# Altium footprint library 13-IC Packages-1bga1.PcbLib: 72 footprints (part 5 of 6) (continued)
## CI_ATMEL_TFBGA324_0MM8_SOCKET6088 [mm] (continued)
Top Layer keep-out:
  circle w0.025: c-8.863,-8.863 r1.805
  circle w0.025: c-8.863,8.863 r1.805
  circle w0.025: c8.863,-8.863 r1.805
  circle w0.025: c8.863,8.863 r1.805
Bottom Layer keep-out:
  circle w0.025: c-8.863,-8.863 r1.805
  circle w0.025: c-8.863,8.863 r1.805
  circle w0.025: c8.863,-8.863 r1.805
  circle w0.025: c8.863,8.863 r1.805
Top Overlay:
  lines w0.18: -8.703,6.8 -8.703,8.95 -6.552,8.95 ; -9.927,-10.175 -9.927,-3.185 -9.062,-3.185 -9.062,6.94 -9.927,6.94 -9.927,10.175 -6.692,10.175 -6.693,9.31 7.188,9.31 7.187,10.175 10.422,10.175 10.422,4.94 9.558,4.94 9.557,-7.185 10.422,-7.185 10.422,-10.175 7.187,-10.175 7.188,-9.31 -6.693,-9.31 -6.692,-10.175 -9.927,-10.175 ; -7.278,-7.525 -7.278,7.525 7.773,7.525 7.773,-7.525 -7.278,-7.525
Top Solder:
  drawing of 6 lines, arcs and shapes, not listed
Bottom Solder:
  drawing of 6 lines, arcs and shapes, not listed
Mechanical 6:
  lines w0.18: -8.703,6.8 -8.703,8.089 ; -8.077,8.95 -6.552,8.95 ; -9.927,-10.175 -9.927,-3.185 -9.062,-3.185 -9.062,6.94 -9.927,6.94 -9.927,10.175 -6.692,10.175 -6.693,9.31 7.188,9.31 7.187,10.175 10.422,10.175 10.422,4.94 9.558,4.94 9.557,-7.185 10.422,-7.185 10.422,-10.175 7.187,-10.175 7.188,-9.31 -6.693,-9.31 -6.692,-10.175 -9.927,-10.175 ; -7.278,-7.525 -7.278,7.525 7.773,7.525 7.773,-7.525 -7.278,-7.525
Mechanical 8:
  text "2.54" at 12.563,6.613 h0.5
  text "15.05" at 11.497,-2.125 h0.5
  text "3.235" at -4.903,11.83 h0.5
  text "3.235" at -11.923,3.265 h0.5
  text "0.8" at -1.837,10.67 h0.5
  text "20.35" at 14.087,-3.05 h0.5
  text "20.35" at -1.457,16.01 h0.5
  text "2.06" at -13.128,5.227 h0.5
  text "17.725" at -0.275,13.915 h0.5
  text "2.31" at -5.115,12.85 h0.5
  text "17.725" at -15.428,-1.413 h0.5
Mechanical 16:
  drawing of 36 lines, arcs and shapes, not listed
Multi-Layer keep-out:
  circle w0.025: c-8.863,-8.863 r1.305
  circle w0.025: c8.863,-8.863 r1.305
  circle w0.025: c8.863,8.863 r1.305
  circle w0.025: c-8.863,8.863 r1.305
  circle w0.025: c-8.863,-3.783 r0.925
  circle w0.025: c8.862,6.323 r0.925
Mechanical 18:
  text "A8" at -0.811,6.941 h0.25
  text "E9" at -0.011,3.741 h0.25
  text "B6" at -2.411,6.141 h0.25
  text "B7" at -1.611,6.141 h0.25
  text "A5" at -3.211,6.941 h0.25
  text "D7" at -1.611,4.541 h0.25
  text "C6" at -2.411,5.341 h0.25
  text "E7" at -1.611,3.741 h0.25
  text "B5" at -3.211,6.141 h0.25
  text "D6" at -2.411,4.541 h0.25
  text "F7" at -1.611,2.941 h0.25
  text "A4" at -4.011,6.941 h0.25
  text "C5" at -3.211,5.341 h0.25
  text "B4" at -4.011,6.141 h0.25
  text "E6" at -2.411,3.741 h0.25
  text "D5" at -3.211,4.541 h0.25
  text "A3" at -4.811,6.941 h0.25
  text "C4" at -4.011,5.341 h0.25
  text "A1" at -6.411,6.941 h0.25
  text "A2" at -5.611,6.941 h0.25
  text "B2" at -5.611,6.141 h0.25
  text "B3" at -4.811,6.141 h0.25
  text "B1" at -6.411,6.141 h0.25
  text "D8" at -0.811,4.541 h0.25
  text "A6" at -2.411,6.941 h0.25
  text "C7" at -1.611,5.341 h0.25
  text "D9" at -0.011,4.541 h0.25
  text "A9" at -0.011,6.941 h0.25
  text "E15" at 4.86,3.812 h0.25
  text "E16" at 5.66,3.812 h0.25
  text "D18" at 7.26,4.612 h0.25
  text "D17" at 6.46,4.612 h0.25
  text "C18" at 7.26,5.412 h0.25
  text "B18" at 7.26,6.212 h0.25
  text "A18" at 7.26,7.012 h0.25
  text "B17" at 6.46,6.212 h0.25
  text "C10" at 0.86,5.412 h0.25
  text "B10" at 0.86,6.212 h0.25
  text "C17" at 6.46,5.412 h0.25
  text "A17" at 6.46,7.012 h0.25
  text "D15" at 4.86,4.612 h0.25
  text "C15" at 4.86,5.412 h0.25
  text "V14" at 4.06,-6.588 h0.25
  text "B16" at 5.66,6.212 h0.25
  text "B15" at 4.86,6.212 h0.25
  text "D14" at 4.06,4.612 h0.25
  text "C14" at 4.06,5.412 h0.25
  text "A15" at 4.86,7.012 h0.25
  text "B14" at 4.06,6.212 h0.25
  text "P6" at -2.411,-3.459 h0.25
  text "D13" at 3.26,4.612 h0.25
  text "C13" at 3.26,5.412 h0.25
  text "C1" at -6.411,5.341 h0.25
  text "E13" at 3.26,3.812 h0.25
  text "B13" at 3.26,6.212 h0.25
  text "E12" at 2.46,3.812 h0.25
  text "V9" at -0.011,-6.659 h0.25
  text "D1" at -6.411,4.541 h0.25
  text "D12" at 2.46,4.612 h0.25
  text "C12" at 2.46,5.412 h0.25
  text "H1" at -6.411,1.341 h0.25
  text "M3" at -4.811,-1.859 h0.25
  text "F2" at -5.611,2.941 h0.25
  text "M4" at -4.011,-1.859 h0.25
  text "R9" at -0.011,-4.259 h0.25
  text "L7" at -1.611,-1.059 h0.25
  text "T8" at -0.811,-5.059 h0.25
  text "N4" at -4.011,-2.659 h0.25
  text "L11" at 1.66,-0.988 h0.25
  text "P1" at -6.411,-3.459 h0.25
  text "T10" at 0.86,-4.988 h0.25
  text "M5" at -3.211,-1.859 h0.25
  text "M6" at -2.411,-1.859 h0.25
  text "P2" at -5.611,-3.459 h0.25
  text "V8" at -0.811,-6.659 h0.25
  text "N2" at -5.611,-2.659 h0.25
  text "N3" at -4.811,-2.659 h0.25
  text "N5" at -3.211,-2.659 h0.25
  text "R1" at -6.411,-4.259 h0.25
  text "P3" at -4.811,-3.459 h0.25
  text "R4" at -4.011,-4.259 h0.25
  text "V2" at -5.611,-6.659 h0.25
  text "N6" at -2.411,-2.659 h0.25
  text "G1" at -6.411,2.141 h0.25
  text "U8" at -0.811,-5.859 h0.25
  text "L1" at -6.411,-1.059 h0.25
  text "U3" at -4.811,-5.859 h0.25
  text "U2" at -5.611,-5.859 h0.25
  text "T7" at -1.611,-5.059 h0.25
  text "P4" at -4.011,-3.459 h0.25
  text "V3" at -4.811,-6.659 h0.25
  text "U1" at -6.411,-5.859 h0.25
  text "U9" at -0.011,-5.859 h0.25
  text "U4" at -4.011,-5.859 h0.25
  text "M9" at -0.011,-1.859 h0.25
  text "L10" at 0.86,-0.988 h0.25
  text "D2" at -5.611,4.541 h0.25
  text "V1" at -6.411,-6.659 h0.25
  text "F3" at -4.811,2.941 h0.25
  text "G2" at -5.611,2.141 h0.25
  text "E2" at -5.611,3.741 h0.25
  text "F1" at -6.411,2.941 h0.25
  text "E1" at -6.411,3.741 h0.25
  text "T9" at -0.011,-5.059 h0.25
  text "L9" at -0.011,-1.059 h0.25
  text "B8" at -0.811,6.141 h0.25
  text "C8" at -0.811,5.341 h0.25
  text "R7" at -1.611,-4.259 h0.25
  text "F9" at -0.011,2.941 h0.25
  text "V7" at -1.611,-6.659 h0.25
  text "J16" at 5.66,0.612 h0.25
  text "G17" at 6.46,2.212 h0.25
  text "G16" at 5.66,2.212 h0.25
  text "J18" at 7.26,0.612 h0.25
  text "H18" at 7.26,1.412 h0.25
  text "H14" at 4.06,1.412 h0.25
  text "M10" at 0.86,-1.788 h0.25
  text "H15" at 4.86,1.412 h0.25
  text "J17" at 6.46,0.612 h0.25
  text "H17" at 6.46,1.412 h0.25
  text "V11" at 1.66,-6.588 h0.25
  text "G18" at 7.26,2.212 h0.25
  text "V16" at 5.66,-6.588 h0.25
  text "G14" at 4.06,2.212 h0.25
  text "R2" at -5.611,-4.259 h0.25
  text "H16" at 5.66,1.412 h0.25
  text "R8" at -0.811,-4.259 h0.25
  text "G15" at 4.86,2.212 h0.25
  text "V12" at 2.46,-6.588 h0.25
  text "A13" at 3.26,7.012 h0.25
  text "B12" at 2.46,6.212 h0.25
  text "F10" at 0.86,3.012 h0.25
  text "V15" at 4.86,-6.588 h0.25
  text "F12" at 2.46,3.012 h0.25
  text "A14" at 4.06,7.012 h0.25
  text "C11" at 1.66,5.412 h0.25
  text "A11" at 1.66,7.012 h0.25
  text "E11" at 1.66,3.812 h0.25
  text "B11" at 1.66,6.212 h0.25
  text "D11" at 1.66,4.612 h0.25
  text "A12" at 2.46,7.012 h0.25
  text "C9" at -0.011,5.341 h0.25
  text "A10" at 0.86,7.012 h0.25
  text "F11" at 1.66,3.012 h0.25
  text "D10" at 0.86,4.612 h0.25
  text "N13" at 3.26,-2.588 h0.25
  text "E10" at 0.86,3.812 h0.25
  text "P12" at 2.46,-3.388 h0.25
  text "T15" at 4.86,-4.988 h0.25
  text "R12" at 2.46,-4.188 h0.25
  text "T16" at 5.66,-4.988 h0.25
  text "N12" at 2.46,-2.588 h0.25
  text "M12" at 2.46,-1.788 h0.25
  text "T11" at 1.66,-4.988 h0.25
  text "U14" at 4.06,-5.788 h0.25
  text "L8" at -0.811,-1.059 h0.25
  text "M13" at 3.26,-1.788 h0.25
  text "T12" at 2.46,-4.988 h0.25
  text "V4" at -4.011,-6.659 h0.25
  text "M8" at -0.811,-1.859 h0.25
  text "N11" at 1.66,-2.588 h0.25
  text "U13" at 3.26,-5.788 h0.25
  text "R6" at -2.411,-4.259 h0.25
  text "M11" at 1.66,-1.788 h0.25
  text "V6" at -2.411,-6.659 h0.25
  text "R5" at -3.211,-4.259 h0.25
  text "N9" at -0.011,-2.659 h0.25
  text "T5" at -3.211,-5.059 h0.25
  text "U5" at -3.211,-5.859 h0.25
  text "P13" at 3.26,-3.388 h0.25
  text "R18" at 7.26,-4.188 h0.25
  text "M7" at -1.611,-1.859 h0.25
  text "R13" at 3.26,-4.188 h0.25
  text "T13" at 3.26,-4.988 h0.25
  text "P7" at -1.611,-3.459 h0.25
  text "A7" at -1.611,6.941 h0.25
  text "T18" at 7.26,-4.988 h0.25
  text "H2" at -5.611,1.341 h0.25
  text "U7" at -1.611,-5.859 h0.25
  text "N8" at -0.811,-2.659 h0.25
  text "H8" at -0.811,1.341 h0.25
  text "G6" at -2.411,2.141 h0.25
  text "P8" at -0.811,-3.459 h0.25
  text "J5" at -3.211,0.541 h0.25
  text "L4" at -4.011,-1.059 h0.25
  text "G8" at -0.811,2.141 h0.25
  text "H7" at -1.611,1.341 h0.25
  text "H6" at -2.411,1.341 h0.25
  text "R3" at -4.811,-4.259 h0.25
  text "J3" at -4.811,0.541 h0.25
  text "M1" at -6.411,-1.859 h0.25
  text "H4" at -4.011,1.341 h0.25
  text "T1" at -6.411,-5.059 h0.25
  text "J2" at -5.611,0.541 h0.25
  text "N1" at -6.411,-2.659 h0.25
  text "J4" at -4.011,0.541 h0.25
  text "L5" at -3.211,-1.059 h0.25
  text "J6" at -2.411,0.541 h0.25
  text "K3" at -4.811,-0.259 h0.25
  text "M2" at -5.611,-1.859 h0.25
  text "J1" at -6.411,0.541 h0.25
  text "P5" at -3.211,-3.459 h0.25
  text "T2" at -5.611,-5.059 h0.25
  text "K6" at -2.411,-0.259 h0.25
  text "T3" at -4.811,-5.059 h0.25
  text "K4" at -4.011,-0.259 h0.25
  text "K8" at -0.811,-0.259 h0.25
  text "L6" at -2.411,-1.059 h0.25
  text "K5" at -3.211,-0.259 h0.25
  text "J8" at -0.811,0.541 h0.25
  text "T4" at -4.011,-5.059 h0.25
  text "K2" at -5.611,-0.259 h0.25
  text "K7" at -1.611,-0.259 h0.25
  text "L3" at -4.811,-1.059 h0.25
  text "K1" at -6.411,-0.259 h0.25
  text "J7" at -1.611,0.541 h0.25
  text "L2" at -5.611,-1.059 h0.25
  text "G4" at -4.011,2.141 h0.25
  text "F4" at -4.011,2.941 h0.25
  text "G5" at -3.211,2.141 h0.25
  text "H5" at -3.211,1.341 h0.25
  text "F5" at -3.211,2.941 h0.25
  text "V18" at 7.26,-6.588 h0.25
  text "G7" at -1.611,2.141 h0.25
  text "G3" at -4.811,2.141 h0.25
  text "F8" at -0.811,2.941 h0.25
  text "R16" at 5.66,-4.188 h0.25
  text "R15" at 4.86,-4.188 h0.25
  text "T14" at 4.06,-4.988 h0.25
  text "P15" at 4.86,-3.388 h0.25
  text "P16" at 5.66,-3.388 h0.25
  text "P17" at 6.46,-3.388 h0.25
  text "R14" at 4.06,-4.188 h0.25
  text "P14" at 4.06,-3.388 h0.25
  text "N15" at 4.86,-2.588 h0.25
  text "P9" at -0.011,-3.459 h0.25
  text "N16" at 5.66,-2.588 h0.25
  text "P18" at 7.26,-3.388 h0.25
  text "N17" at 6.46,-2.588 h0.25
  text "N18" at 7.26,-2.588 h0.25
  text "N14" at 4.06,-2.588 h0.25
  text "M15" at 4.86,-1.788 h0.25
  text "M16" at 5.66,-1.788 h0.25
  text "E5" at -3.211,3.741 h0.25
  text "E8" at -0.811,3.741 h0.25
  text "C16" at 5.66,5.412 h0.25
  text "D3" at -4.811,4.541 h0.25
  text "H13" at 3.26,1.412 h0.25
  text "J12" at 2.46,0.612 h0.25
  text "J13" at 3.26,0.612 h0.25
  text "U12" at 2.46,-5.788 h0.25
  text "U17" at 6.46,-5.788 h0.25
  text "G9" at -0.011,2.141 h0.25
  text "H9" at -0.011,1.341 h0.25
  text "H10" at 0.86,1.412 h0.25
  text "H12" at 2.46,1.412 h0.25
  text "J9" at -0.011,0.541 h0.25
  text "J10" at 0.86,0.612 h0.25
  text "J11" at 1.66,0.612 h0.25
  text "K11" at 1.66,-0.188 h0.25
  text "K12" at 2.46,-0.188 h0.25
  text "M17" at 6.46,-1.788 h0.25
  text "L14" at 4.06,-0.988 h0.25
  text "M18" at 7.26,-1.788 h0.25
  text "A16" at 5.66,7.012 h0.25
  text "L15" at 4.86,-0.988 h0.25
  text "L16" at 5.66,-0.988 h0.25
  text "L18" at 7.26,-0.988 h0.25
  text "L17" at 6.46,-0.988 h0.25
  text "K14" at 4.06,-0.188 h0.25
  text "K15" at 4.86,-0.188 h0.25
  text "K16" at 5.66,-0.188 h0.25
  text "K18" at 7.26,-0.188 h0.25
  text "K17" at 6.46,-0.188 h0.25
  text "J14" at 4.06,0.612 h0.25
  text "J15" at 4.86,0.612 h0.25
  text "U18" at 7.26,-5.788 h0.25
  text "E3" at -4.811,3.741 h0.25
  text "U11" at 1.66,-5.788 h0.25
  text "V17" at 6.46,-6.588 h0.25
  text "P11" at 1.66,-3.388 h0.25
  text "C2" at -5.611,5.341 h0.25
  text "K9" at -0.011,-0.259 h0.25
  text "K10" at 0.86,-0.188 h0.25
  text "V13" at 3.26,-6.588 h0.25
  text "D4" at -4.011,4.541 h0.25
  text "G12" at 2.46,2.212 h0.25
  text "G13" at 3.26,2.212 h0.25
  text "E18" at 7.26,3.812 h0.25
  text "H11" at 1.66,1.412 h0.25
  text "H3" at -4.811,1.341 h0.25
  text "D16" at 5.66,4.612 h0.25
  text "F6" at -2.411,2.941 h0.25
  text "G10" at 0.86,2.212 h0.25
  text "G11" at 1.66,2.212 h0.25
  text "C3" at -4.811,5.341 h0.25
  text "K13" at 3.26,-0.188 h0.25
  text "L12" at 2.46,-0.988 h0.25
  text "L13" at 3.26,-0.988 h0.25
  text "M14" at 4.06,-1.788 h0.25
  text "F13" at 3.26,3.012 h0.25
  text "F14" at 4.06,3.012 h0.25
  text "F18" at 7.26,3.012 h0.25
  text "F15" at 4.86,3.012 h0.25
  text "E14" at 4.06,3.812 h0.25
  text "F17" at 6.46,3.012 h0.25
  text "F16" at 5.66,3.012 h0.25
  text "E17" at 6.46,3.812 h0.25
  text "U16" at 5.66,-5.788 h0.25
  text "R17" at 6.46,-4.188 h0.25
  text "T17" at 6.46,-4.988 h0.25
  text "U15" at 4.86,-5.788 h0.25
  text "R10" at 0.86,-4.188 h0.25
  text "P10" at 0.86,-3.388 h0.25
  text "N10" at 0.86,-2.588 h0.25
  text "V10" at 0.86,-6.588 h0.25
  text "U10" at 0.86,-5.788 h0.25
  text "R11" at 1.66,-4.188 h0.25
  text "B9" at -0.011,6.141 h0.25
  text "E4" at -4.011,3.741 h0.25
  text "U6" at -2.411,-5.859 h0.25
  text "T6" at -2.411,-5.059 h0.25
  text "N7" at -1.611,-2.659 h0.25
  text "V5" at -3.211,-6.659 h0.25
Mechanical 20:
  text ".Designator" at 0.772,1.231 h1.12
Mechanical 29:
  text "3MM" at -1.253,-8.5 h0.5
3D body "tfbga-324.stp": height 1.2, standoff 0, extent -7.271,-7.5 7.729,7.5

## CI_MICRON_FBGA60_8X10_ARM [mm]
height 25.75
pads (60):
  round 0.4 smd: A1(-3.2,4) A2(-2.4,4) A3(-1.6,4) A7(1.6,4) A8(2.4,4) A9(3.2,4) B1(-3.2,3.2) B2(-2.4,3.2) B3(-1.6,3.2) B7(1.6,3.2) B8(2.4,3.2) B9(3.2,3.2) C1(-3.2,2.4) C2(-2.4,2.4) C3(-1.6,2.4) C7(1.6,2.4) C8(2.4,2.4) C9(3.2,2.4) D1(-3.2,1.6) D2(-2.4,1.6) D3(-1.6,1.6) D7(1.6,1.6) D8(2.4,1.6) D9(3.2,1.6) E1(-3.2,0.8) E2(-2.4,0.8) E3(-1.6,0.8) E7(1.6,0.8) E8(2.4,0.8) E9(3.2,0.8) F2(-2.4,0) F3(-1.6,0) F7(1.6,0) F8(2.4,0) F9(3.2,0) G1(-3.2,-0.8) G2(-2.4,-0.8) G3(-1.6,-0.8) G7(1.6,-0.8) G8(2.4,-0.8) H2(-2.4,-1.6) H3(-1.6,-1.6) H7(1.6,-1.6) H8(2.4,-1.6) H9(3.2,-1.6) J1(-3.2,-2.4) J2(-2.4,-2.4) J3(-1.6,-2.4) J7(1.6,-2.4) J8(2.4,-2.4) K2(-2.4,-3.2) K3(-1.6,-3.2) K7(1.6,-3.2) K8(2.4,-3.2) K9(3.2,-3.2) L1(-3.2,-4) L2(-2.4,-4) L3(-1.6,-4) L7(1.6,-4) L8(2.4,-4)
Top Overlay:
  region: -4.089,4.343 -3.378,5.055 -3.378,5.105 -4.064,5.105 -4.089,5.08
  lines w0.18: -4.465,4.445 -4.465,5.465 -3.429,5.465 ; -4.075,-5.075 4.075,-5.075 4.075,5.075 -4.075,5.075 -4.075,-5.075
Mechanical 6:
  lines w0.18: -4.465,4.445 -4.465,5.465 -3.429,5.465 ; -4.075,-5.075 4.075,-5.075 4.075,5.075 -4.075,5.075 -4.075,-5.075
Mechanical 8:
  text "8.15" at -1.188,9.15 h0.5
  text "0.8" at -4.25,-1.5 h0.5
  text "8" at 4.65,0.625 h0.5
  text "1.075" at -6.15,1.175 h0.5
  text "10.15" at 5.85,-1.225 h0.5
  text "6.4" at -0.65,-6.6 h0.5
  text "1.875" at 6.125,6.4 h0.5
  text "3.2" at -0.65,6.4 h0.5
  text "0.8" at -1.65,7.4 h0.5
Mechanical 16:
  circle w0.025: c-3.2,4 r0.4
  lines w0.025: -4.075,-5.075 4.075,-5.075 4.075,5.075 -4.075,5.075 -4.075,-5.075
Mechanical 18:
  text "A8" at 2.6,4 h0.25
  text "G1" at -3,-0.8 h0.25
  text "L3" at -1.4,-4 h0.25
  text "L7" at 1.8,-4 h0.25
  text "A2" at -2.2,4 h0.25
  text "H8" at 2.6,-1.6 h0.25
  text "H3" at -1.4,-1.6 h0.25
  text "H7" at 1.8,-1.6 h0.25
  text "J2" at -2.2,-2.4 h0.25
  text "J8" at 2.6,-2.4 h0.25
  text "J3" at -1.4,-2.4 h0.25
  text "J7" at 1.8,-2.4 h0.25
  text "K2" at -2.2,-3.2 h0.25
  text "K8" at 2.6,-3.2 h0.25
  text "K3" at -1.4,-3.2 h0.25
  text "H2" at -2.2,-1.6 h0.25
  text "K7" at 1.8,-3.2 h0.25
  text "A1" at -3,4 h0.25
  text "A9" at 3.4,4 h0.25
  text "C1" at -3,2.4 h0.25
  text "C3" at -1.4,2.4 h0.25
  text "C7" at 1.8,2.4 h0.25
  text "C9" at 3.4,2.4 h0.25
  text "E1" at -3,0.8 h0.25
  text "E9" at 3.4,0.8 h0.25
  text "H9" at 3.4,-1.6 h0.25
  text "L1" at -3,-4 h0.25
  text "A3" at -1.4,4 h0.25
  text "A7" at 1.8,4 h0.25
  text "B2" at -2.2,3.2 h0.25
  text "B8" at 2.6,3.2 h0.25
  text "D2" at -2.2,1.6 h0.25
  text "D8" at 2.6,1.6 h0.25
  text "E3" at -1.4,0.8 h0.25
  text "E7" at 1.8,0.8 h0.25
  text "F9" at 3.4,0 h0.25
  text "J1" at -3,-2.4 h0.25
  text "K9" at 3.4,-3.2 h0.25
  text "E2" at -2.2,0.8 h0.25
  text "C8" at 2.6,2.4 h0.25
  text "C2" at -2.2,2.4 h0.25
  text "D7" at 1.8,1.6 h0.25
  text "D3" at -1.4,1.6 h0.25
  text "D1" at -3,1.6 h0.25
  text "D9" at 3.4,1.6 h0.25
  text "B1" at -3,3.2 h0.25
  text "B9" at 3.4,3.2 h0.25
  text "G2" at -2.2,-0.8 h0.25
  text "F2" at -2.2,0 h0.25
  text "G3" at -1.4,-0.8 h0.25
  text "E8" at 2.6,0.8 h0.25
  text "F8" at 2.6,0 h0.25
  text "F3" at -1.4,0 h0.25
  text "G7" at 1.8,-0.8 h0.25
  text "G8" at 2.6,-0.8 h0.25
  text "F7" at 1.8,0 h0.25
  text "B7" at 1.8,3.2 h0.25
  text "B3" at -1.4,3.2 h0.25
  text "L8" at 2.6,-4 h0.25
  text "L2" at -2.2,-4 h0.25
Mechanical 20:
  text ".Designator" at 1.241,0.5 h1.12
Mechanical 29:
  text "5MM" at -8.8,-8.3 h0.5
  text "3MM" at -6.1,-7.5 h0.5
3D body "fbga60-8x10.stp": height 1, standoff 0, extent -4.075,-5.075 4.075,5.075

## CI_MICRON_VFBGA63_0MM8 [mm]
height 25.75
pads (63):
  round 0.4 smd: A1(-3.6,4.4) A2(-2.8,4.4) A9(2.8,4.4) A10(3.6,4.4) B1(-3.6,3.6) B9(2.8,3.6) B10(3.6,3.6) C3(-2,2.8) C4(-1.2,2.8) C5(-0.4,2.8) C6(0.4,2.8) C7(1.2,2.8) C8(2,2.8) D3(-2,2) D4(-1.2,2) D5(-0.4,2) D6(0.4,2) D7(1.2,2) D8(2,2) E3(-2,1.2) E4(-1.2,1.2) E5(-0.4,1.2) E6(0.4,1.2) E7(1.2,1.2) E8(2,1.2) F3(-2,0.4) F4(-1.2,0.4) F5(-0.4,0.4) F6(0.4,0.4) F7(1.2,0.4) F8(2,0.4) G3(-2,-0.4) G4(-1.2,-0.4) G5(-0.4,-0.4) G6(0.4,-0.4) G7(1.2,-0.4) G8(2,-0.4) H3(-2,-1.2) H4(-1.2,-1.2) H5(-0.4,-1.2) H6(0.4,-1.2) H7(1.2,-1.2) H8(2,-1.2) J3(-2,-2) J4(-1.2,-2) J5(-0.4,-2) J6(0.4,-2) J7(1.2,-2) J8(2,-2) K3(-2,-2.8) K4(-1.2,-2.8) K5(-0.4,-2.8) K6(0.4,-2.8) K7(1.2,-2.8) K8(2,-2.8) L1(-3.6,-3.6) L2(-2.8,-3.6) L9(2.8,-3.6) L10(3.6,-3.6) M1(-3.6,-4.4) M2(-2.8,-4.4) M9(2.8,-4.4) M10(3.6,-4.4)
Top Overlay:
  lines w0.18: -5.675,4.775 -5.675,6.925 -3.525,6.925 ; -5.3,-6.55 -5.3,6.55 5.3,6.55 5.3,-6.55 -5.3,-6.55
Mechanical 6:
  lines w0.18: -5.675,4.775 -5.675,6.925 -3.525,6.925 ; -5.3,-6.55 -5.3,6.55 5.3,6.55 5.3,-6.55 -5.3,-6.55
Mechanical 8:
  text "0.8" at -0.6,7.6 h0.5
  text "10.6" at 1.062,8.65 h0.5
  text "13.1" at 6.55,-0.787 h0.5
Mechanical 16:
  circle w0.025: c-4,5.2 r0.4
  lines w0.025: -5.3,-6.55 -5.3,6.55 5.3,6.55 5.3,-6.55 -5.3,-6.55
Mechanical 18:
  text "C4" at -1.67,2.8 h0.25
  text "H4" at -1.67,-1.2 h0.25
  text "J4" at -1.67,-2 h0.25
  text "K4" at -1.67,-2.8 h0.25
  text "K5" at -0.87,-2.8 h0.25
  text "K6" at -0.07,-2.8 h0.25
  text "J7" at 0.73,-2 h0.25
  text "K7" at 0.73,-2.8 h0.25
  text "J8" at 1.53,-2 h0.25
  text "H3" at -2.47,-1.2 h0.25
  text "J3" at -2.47,-2 h0.25
  text "H5" at -0.87,-1.2 h0.25
  text "J5" at -0.87,-2 h0.25
  text "H6" at -0.07,-1.2 h0.25
  text "G6" at -0.07,-0.4 h0.25
  text "H7" at 0.73,-1.2 h0.25
  text "G7" at 0.73,-0.4 h0.25
  text "D3" at -2.47,2 h0.25
  text "G4" at -1.67,-0.4 h0.25
  text "H8" at 1.53,-1.2 h0.25
  text "J6" at -0.07,-2 h0.25
  text "D5" at -0.87,2 h0.25
  text "C7" at 0.73,2.8 h0.25
  text "C8" at 1.53,2.8 h0.25
  text "C6" at -0.07,2.8 h0.25
  text "C5" at -0.87,2.8 h0.25
  text "F7" at 0.73,0.4 h0.25
  text "K3" at -2.47,-2.8 h0.25
  text "K8" at 1.53,-2.8 h0.25
  text "C3" at -2.47,2.8 h0.25
  text "D4" at -1.67,2 h0.25
  text "D7" at 0.73,2 h0.25
  text "D6" at -0.07,2 h0.25
  text "B10" at 3.3,3.6 h0.25
  text "B9" at 2.6,3.6 h0.25
  text "B1" at -3.8,3.6 h0.25
  text "A10" at 3.3,4.4 h0.25
  text "M10" at 3.3,-4.4 h0.25
  text "M9" at 2.6,-4.4 h0.25
  text "M2" at -3,-4.4 h0.25
  text "M1" at -3.8,-4.4 h0.25
  text "L10" at 3.3,-3.6 h0.25
  text "L9" at 2.6,-3.6 h0.25
  text "A9" at 2.6,4.4 h0.25
  text "L2" at -3,-3.6 h0.25
  text "L1" at -3.8,-3.6 h0.25
  text "G8" at 1.53,-0.4 h0.25
  text "G3" at -2.47,-0.4 h0.25
  text "F8" at 1.53,0.4 h0.25
  text "F6" at -0.07,0.4 h0.25
  text "A2" at -3,4.4 h0.25
  text "F5" at -0.87,0.4 h0.25
  text "F4" at -1.67,0.4 h0.25
  text "F3" at -2.47,0.4 h0.25
  text "E8" at 1.53,1.2 h0.25
  text "E7" at 0.73,1.2 h0.25
  text "E6" at -0.07,1.2 h0.25
  text "E5" at -0.87,1.2 h0.25
  text "E4" at -1.67,1.2 h0.25
  text "E3" at -2.47,1.2 h0.25
  text "D8" at 1.53,2 h0.25
  text "A1" at -3.8,4.4 h0.25
  text "G5" at -0.87,-0.4 h0.25
Mechanical 29:
  text "5MM" at -9.95,-11.267 h0.5
  text "3MM" at -8.05,-9.417 h0.5
3D body "BGA63C80P10X12_1050X1300X100.stp": height 1, standoff 0, extent -5.377,-6.627 5.123,6.373

## FRES-MAPBGA-256 [mm]
height 3.5
pads (256):
  round 0.5 smd mask+0.07: A1(-7.5,7.5) A2(-6.5,7.5) A3(-5.5,7.5) A4(-4.5,7.5) A5(-3.5,7.5) A6(-2.5,7.5) A7(-1.5,7.5) A8(-0.5,7.5) A9(0.5,7.5) A10(1.5,7.5) A11(2.5,7.5) A12(3.5,7.5) A13(4.5,7.5) A14(5.5,7.5) A15(6.5,7.5) A16(7.5,7.5) B1(-7.5,6.5) B2(-6.5,6.5) B3(-5.5,6.5) B4(-4.5,6.5) B5(-3.5,6.5) B6(-2.5,6.5) B7(-1.5,6.5) B8(-0.5,6.5) B9(0.5,6.5) B10(1.5,6.5) B11(2.5,6.5) B12(3.5,6.5) B13(4.5,6.5) B14(5.5,6.5) B15(6.5,6.5) B16(7.5,6.5) C1(-7.5,5.5) C2(-6.5,5.5) C3(-5.5,5.5) C4(-4.5,5.5) C5(-3.5,5.5) C6(-2.5,5.5) C7(-1.5,5.5) C8(-0.5,5.5) C9(0.5,5.5) C10(1.5,5.5) C11(2.5,5.5) C12(3.5,5.5) C13(4.5,5.5) C14(5.5,5.5) C15(6.5,5.5) C16(7.5,5.5) D1(-7.5,4.5) D2(-6.5,4.5) D3(-5.5,4.5) D4(-4.5,4.5) D5(-3.5,4.5) D6(-2.5,4.5) D7(-1.5,4.5) D8(-0.5,4.5) D9(0.5,4.5) D10(1.5,4.5) D11(2.5,4.5) D12(3.5,4.5) D13(4.5,4.5) D14(5.5,4.5) D15(6.5,4.5) D16(7.5,4.5) E1(-7.5,3.5) E2(-6.5,3.5) E3(-5.5,3.5) E4(-4.5,3.5) E5(-3.5,3.5) E6(-2.5,3.5) E7(-1.5,3.5) E8(-0.5,3.5) E9(0.5,3.5) E10(1.5,3.5) E11(2.5,3.5) E12(3.5,3.5) E13(4.5,3.5) E14(5.5,3.5) E15(6.5,3.5) E16(7.5,3.5) F1(-7.5,2.5) F2(-6.5,2.5) F3(-5.5,2.5) F4(-4.5,2.5) F5(-3.5,2.5) F6(-2.5,2.5) F7(-1.5,2.5) F8(-0.5,2.5) F9(0.5,2.5) F10(1.5,2.5) F11(2.5,2.5) F12(3.5,2.5) F13(4.5,2.5) F14(5.5,2.5) F15(6.5,2.5) F16(7.5,2.5) G1(-7.5,1.5) G2(-6.5,1.5) G3(-5.5,1.5) G4(-4.5,1.5) G5(-3.5,1.5) G6(-2.5,1.5) G7(-1.5,1.5) G8(-0.5,1.5) G9(0.5,1.5) G10(1.5,1.5) G11(2.5,1.5) G12(3.5,1.5) G13(4.5,1.5) G14(5.5,1.5) G15(6.5,1.5) G16(7.5,1.5) H1(-7.5,0.5) H2(-6.5,0.5) H3(-5.5,0.5) H4(-4.5,0.5) H5(-3.5,0.5) H6(-2.5,0.5) H7(-1.5,0.5) H8(-0.5,0.5) H9(0.5,0.5) H10(1.5,0.5) H11(2.5,0.5) H12(3.5,0.5) H13(4.5,0.5) H14(5.5,0.5) H15(6.5,0.5) H16(7.5,0.5) J1(-7.5,-0.5) J2(-6.5,-0.5) J3(-5.5,-0.5) J4(-4.5,-0.5) J5(-3.5,-0.5) J6(-2.5,-0.5) J7(-1.5,-0.5) J8(-0.5,-0.5) J9(0.5,-0.5) J10(1.5,-0.5) J11(2.5,-0.5) J12(3.5,-0.5) J13(4.5,-0.5) J14(5.5,-0.5) J15(6.5,-0.5) J16(7.5,-0.5) K1(-7.5,-1.5) K2(-6.5,-1.5) K3(-5.5,-1.5) K4(-4.5,-1.5) K5(-3.5,-1.5) K6(-2.5,-1.5) K7(-1.5,-1.5) K8(-0.5,-1.5) K9(0.5,-1.5) K10(1.5,-1.5) K11(2.5,-1.5) K12(3.5,-1.5) K13(4.5,-1.5) K14(5.5,-1.5) K15(6.5,-1.5) K16(7.5,-1.5) L1(-7.5,-2.5) L2(-6.5,-2.5) L3(-5.5,-2.5) L4(-4.5,-2.5) L5(-3.5,-2.5) L6(-2.5,-2.5) L7(-1.5,-2.5) L8(-0.5,-2.5) L9(0.5,-2.5) L10(1.5,-2.5) L11(2.5,-2.5) L12(3.5,-2.5) L13(4.5,-2.5) L14(5.5,-2.5) L15(6.5,-2.5) L16(7.5,-2.5) M1(-7.5,-3.5) M2(-6.5,-3.5) M3(-5.5,-3.5) M4(-4.5,-3.5) M5(-3.5,-3.5) M6(-2.5,-3.5) M7(-1.5,-3.5) M8(-0.5,-3.5) M9(0.5,-3.5) M10(1.5,-3.5) M11(2.5,-3.5) M12(3.5,-3.5) M13(4.5,-3.5) M14(5.5,-3.5) M15(6.5,-3.5) M16(7.5,-3.5) N1(-7.5,-4.5) N2(-6.5,-4.5) N3(-5.5,-4.5) N4(-4.5,-4.5) N5(-3.5,-4.5) N6(-2.5,-4.5) N7(-1.5,-4.5) N8(-0.5,-4.5) N9(0.5,-4.5) N10(1.5,-4.5) N11(2.5,-4.5) N12(3.5,-4.5) N13(4.5,-4.5) N14(5.5,-4.5) N15(6.5,-4.5) N16(7.5,-4.5) P1(-7.5,-5.5) P2(-6.5,-5.5) P3(-5.5,-5.5) P4(-4.5,-5.5) P5(-3.5,-5.5) P6(-2.5,-5.5) P7(-1.5,-5.5) P8(-0.5,-5.5) P9(0.5,-5.5) P10(1.5,-5.5) P11(2.5,-5.5) P12(3.5,-5.5) P13(4.5,-5.5) P14(5.5,-5.5) P15(6.5,-5.5) P16(7.5,-5.5) R1(-7.5,-6.5) R2(-6.5,-6.5) R3(-5.5,-6.5) R4(-4.5,-6.5) R5(-3.5,-6.5) R6(-2.5,-6.5) R7(-1.5,-6.5) R8(-0.5,-6.5) R9(0.5,-6.5) R10(1.5,-6.5) R11(2.5,-6.5) R12(3.5,-6.5) R13(4.5,-6.5) R14(5.5,-6.5) R15(6.5,-6.5) R16(7.5,-6.5) T1(-7.5,-7.5) T2(-6.5,-7.5) T3(-5.5,-7.5) T4(-4.5,-7.5) T5(-3.5,-7.5) T6(-2.5,-7.5) T7(-1.5,-7.5) T8(-0.5,-7.5) T9(0.5,-7.5) T10(1.5,-7.5) T11(2.5,-7.5) T12(3.5,-7.5) T13(4.5,-7.5) T14(5.5,-7.5) T15(6.5,-7.5)
  round 0.5 smd: T16(7.5,-7.5)
Top Overlay:
  circle w0.25: c-9.15,8.35 r0.125
  region: -7.5,8.5 -8.5,7.5 -8.5,8.5
  lines w0.2: -8.5,7.5 -7.5,8.5 ; -8.5,-8.5 -8.5,8.5 8.5,8.5 8.5,-8.5 -8.5,-8.5
Mechanical 13:
  lines w0.1: -8.5,-8.5 -8.5,8.5 8.5,8.5 8.5,-8.5 -8.5,-8.5
Mechanical 15:
  lines w0.05: -8.75,-8.75 -8.75,8.75 8.75,8.75 8.75,-8.75 -8.75,-8.75
  lines w0.1: -0.5,0 0.5,0 ; 0,-0.5 0,0.5
3D body "BGA358C80P20X20_1700X1700X170.stp": height 1.7, standoff 0, extent -8.5,-8.5 8.5,8.5